# Altium footprint library DIP Component.PcbLib: 327 footprints (part 9 of 21)
Each footprint in its own frame and in the unit in brackets; x right, y up, seen from the top. Pads: shape width x height; smd on the part's side, far side on the other; paste and mask are expansions set on the pad; w line width, h text height; cw(c..) or ccw(c..) is an arc to the next point about the centre after c.
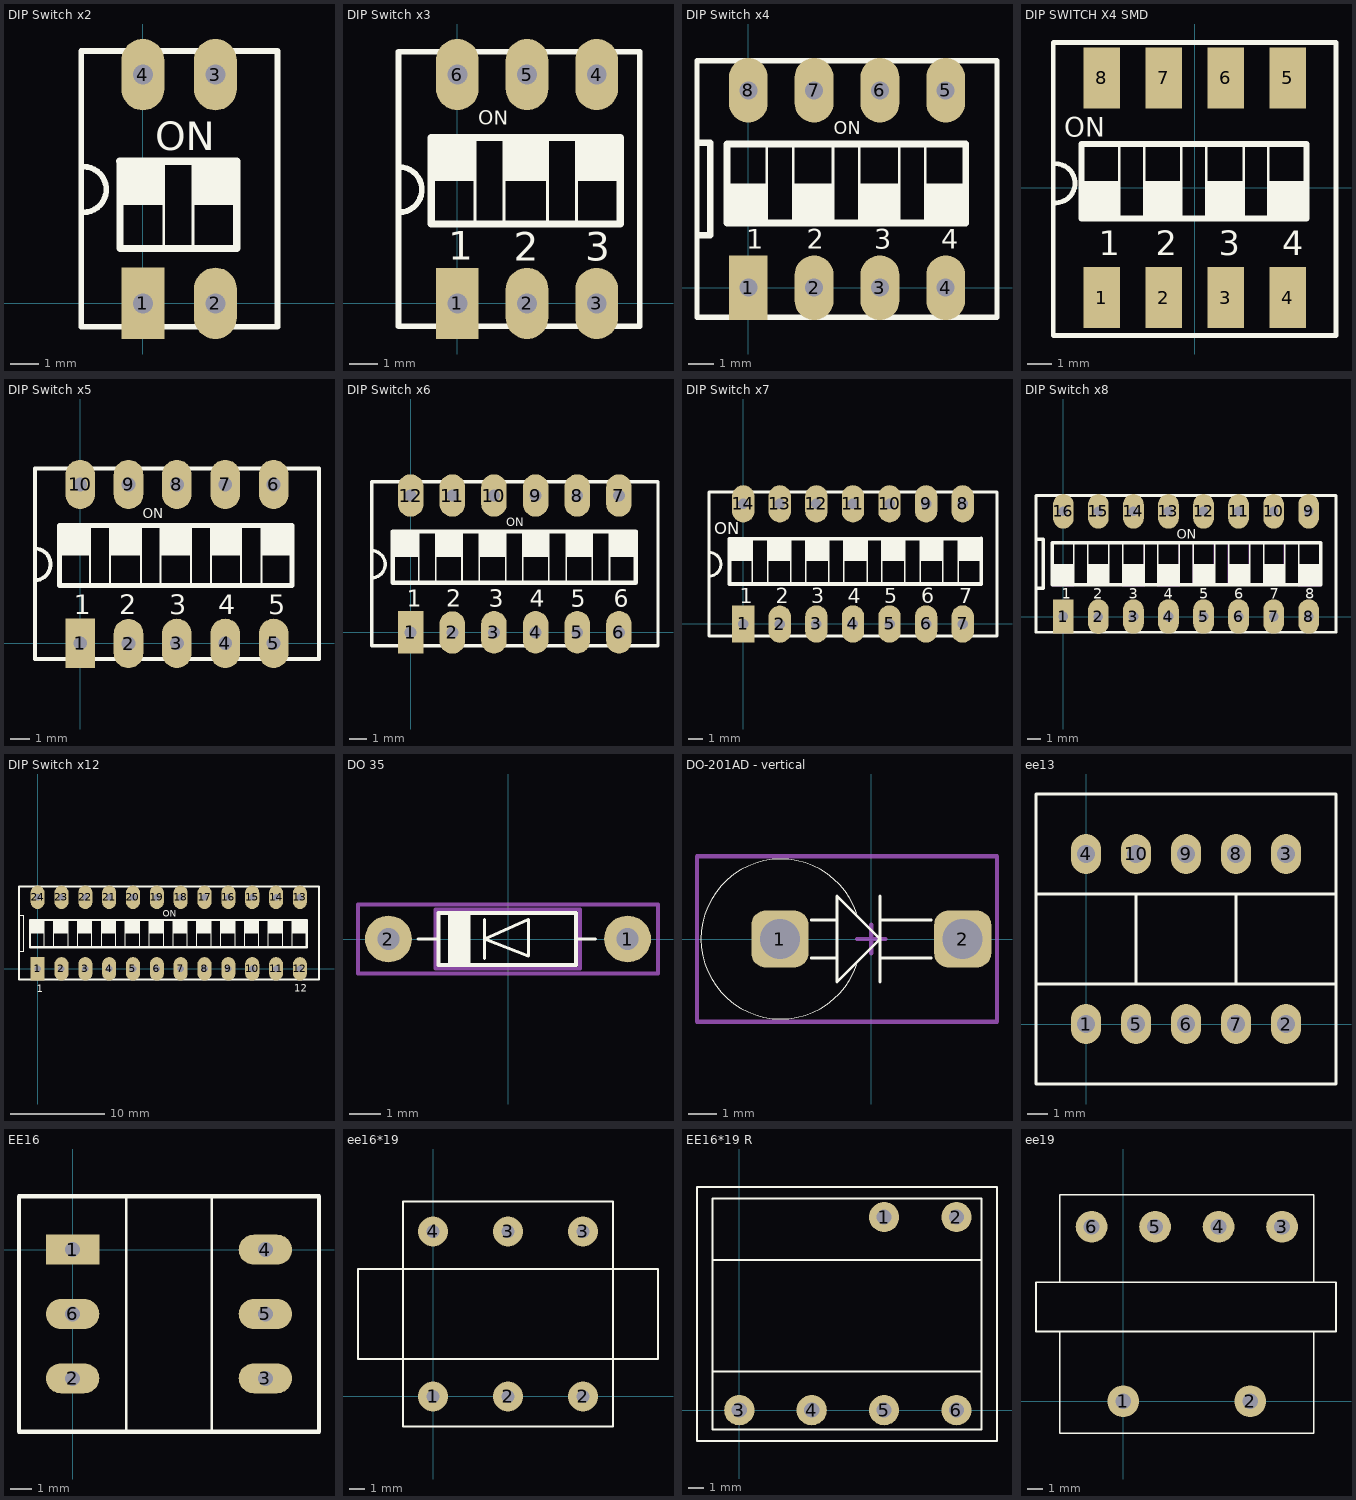
[diagram p8: the footprints below, top view; thin cyan lines are the x and y axes]

## DIP Switch x2 [mm] "Switch DIP 2 way flat slide Thru-Hole-Design:Ali Hafizi"
height 6.5
pads (4):
  rect 1.5x2.5 hole 0.7: 1(0,0)
  oval 1.5x2.5 hole 0.7: 2(2.54,0) 3(2.54,8) 4(0,8)
Top Overlay:
  region: 1.734,4.97 1.734,3.445 3.29,3.445 3.29,4.97
  region: -0.816,4.97 -0.816,3.445 0.74,3.445 0.74,4.97
  lines w0.1: 0.73,1.92 0.73,4.94 ; 1.75,1.92 1.75,4.94
  lines w0.2: -2.08,3.182 ccw(c-2.08,3.982) -2.08,4.782 ; -2.16,-0.82 -2.16,8.83 4.71,8.83 4.71,-0.82 -2.16,-0.82
  lines w0.25: -0.8,1.92 -0.8,4.94
  lines w0.254: -0.816,4.97 3.29,4.97 3.29,1.92 -0.8,1.92
  text "ON" at 0.44,5.36 h1
3D body "dip2.STEP": height 6.91, standoff -1.79, extent -1.98,-1.03 4.52,8.97

## DIP Switch x3 [mm] "Switch DIP 3 way flat slide Thru-Hole-Design:Ali Hafizi"
height 6.5
pads (6):
  rect 1.5x2.5 hole 0.7: 1(0,0)
  oval 1.5x2.5 hole 0.7: 2(2.45,0) 3(4.9,0) 4(4.9,8.05) 5(2.45,8.05) 6(0,8.05)
Top Overlay:
  region: -0.932,5.84 -0.932,4.315 0.624,4.315 0.624,5.84
  region: 1.624,5.84 1.624,4.315 3.18,4.315 3.18,5.84
  region: 4.174,5.84 4.174,4.315 5.73,4.315 5.73,5.84
  lines w0.1: 0.62,2.79 0.62,5.81 ; 1.64,2.79 1.64,5.81 ; 3.17,2.79 3.17,5.81 ; 4.19,2.79 4.19,5.81
  lines w0.2: -2.05,3.202 ccw(c-2.05,4.002) -2.05,4.802 ; -2.07,-0.8 6.41,-0.8 6.41,8.85 -2.07,8.85 -2.07,-0.8
  lines w0.25: -0.92,2.79 -0.92,5.81
  lines w0.254: -0.932,5.84 5.73,5.84 5.73,2.79 -0.92,2.79
  text "3" at 4.5,1.495 h1
  text "2" at 1.98,1.495 h1
  text "1" at -0.33,1.535 h1
  text "ON" at 0.74,6.28 h0.5
3D body "User Library-switch 3.step": height 7, standoff -3.7, extent -1.904,-0.81 6.23,9.09

## DIP Switch x4 [mm] "Switch DIP 4 way flat slide Thru-Hole-Design:Ali Hafizi"
height 6.5
pads (8):
  rect 1.5x2.5 hole 0.7: 1(0,0)
  oval 1.5x2.5 hole 0.7: 2(2.54,0) 3(5.08,0) 4(7.62,0) 5(7.62,7.62) 6(5.08,7.62) 7(2.54,7.62) 8(0,7.62)
Top Overlay:
  region: 8.394,2.497 8.394,4.022 6.838,4.022 6.838,2.497
  region: 5.84,2.497 5.84,4.022 4.284,4.022 4.284,2.497
  region: 3.284,2.497 3.284,4.022 1.728,4.022 1.728,2.497
  region: 0.734,2.497 0.734,4.022 -0.822,4.022 -0.822,2.497
  lines w0.1: 0.718,2.527 0.718,5.547 ; 1.738,2.527 1.738,5.547 ; 3.268,2.527 3.268,5.547 ; 4.288,2.527 4.288,5.547 ; 5.828,2.527 5.828,5.547 ; 6.828,2.527 6.828,5.547
  lines w0.2: -1.981,-1.143 9.601,-1.143 9.601,8.763 -1.981,8.763 -1.981,-1.143
  lines w0.25: 8.388,5.547 8.394,2.497
  lines w0.254: -1.95,2.032 -1.473,2.032 -1.473,5.588 -1.95,5.588 ; 8.388,5.547 -0.822,5.547 -0.822,2.497 8.394,2.497
  text "4" at 7.444,1.495 h0.76
  text "3" at 4.853,1.495 h0.76
  text "2" at 2.261,1.495 h0.76
  text "1" at -0.076,1.495 h0.76
  text "ON" at 3.29,5.93 h0.5
Mechanical 1:
  circle w0.025: c0,0 r0.254
  circle w0.025: c2.54,-0.01 r0.254
  circle w0.025: c5.08,0 r0.254
  circle w0.025: c7.62,0 r0.254
  circle w0.025: c7.62,7.62 r0.254
  circle w0.025: c5.08,7.62 r0.254
  circle w0.025: c2.54,7.62 r0.254
  circle w0.025: c0,7.62 r0.254
3D body: height 6.35, standoff 0.25, extent -0.762,2.562 0.762,3.273
3D body: height 0.76, standoff 0, extent -0.253,7.367 0.253,7.873
3D body: height 0.76, standoff 0, extent 2.287,7.367 2.793,7.873
3D body: height 0.76, standoff 0, extent 4.827,7.367 5.333,7.873
3D body: height 0.76, standoff 0, extent 7.367,7.367 7.873,7.873
3D body: height 0.76, standoff 0, extent -0.253,-0.253 0.253,0.253
3D body: height 0.76, standoff 0, extent 2.287,-0.263 2.793,0.243
3D body: height 0.76, standoff 0, extent 4.827,-0.253 5.333,0.253
3D body: height 0.76, standoff 0, extent 7.367,-0.253 7.873,0.253
3D body: height 3.81, standoff 0, extent -1.981,1.9 -1.473,5.71
3D body: height 5.59, standoff 0, extent -1.981,-1.143 9.652,8.763
3D body: height 0.25, standoff 0.05, extent -1.981,-1.143 9.652,8.763
3D body: height 5.08, standoff 0.25, extent -0.762,3.273 0.762,5.453
3D body: height 5.08, standoff 0.25, extent 4.318,3.273 5.842,5.453
3D body: height 6.35, standoff 0.25, extent 4.318,2.562 5.842,3.273
3D body: height 5.08, standoff 0.25, extent 6.858,3.273 8.382,5.453
3D body: height 6.35, standoff 0.25, extent 6.858,2.562 8.382,3.273
3D body: height 5.59, standoff 0, extent -1.473,2.362 -0.762,5.253
3D body: height 5.59, standoff 0, extent 0.762,2.562 1.778,5.453
3D body: height 5.59, standoff 0, extent 5.842,2.562 6.858,5.453
3D body: height 5.59, standoff 0, extent 3.302,2.562 4.318,5.453
3D body: height 5.08, standoff 0.25, extent 1.778,3.273 3.302,5.453
3D body: height 6.35, standoff 0.25, extent 1.778,2.562 3.302,3.273
3D body: height 5.59, standoff 0.25, extent -1.021,5.975 0.597,7.55
3D body: height 5.59, standoff 0.03, extent -0.618,6.06 0.189,7.478
3D body: height 5.59, standoff 0.25, extent 0.734,5.986 2.3,7.537

## DIP SWITCH X4 SMD [mm] "Switch SMD 4 way flat slide Thru-Hole-Design:Ali Hafizi"
pads (8):
  rect 1.5x2.5 smd: 1(-3.81,-4.5) 2(-1.27,-4.5) 3(1.27,-4.5) 4(3.81,-4.5) 5(3.81,4.5) 6(1.27,4.5) 7(-1.27,4.5) 8(-3.81,4.5)
Top Overlay:
  region: 4.584,-1.253 4.584,0.272 3.028,0.272 3.028,-1.253
  region: 2.03,-1.253 2.03,0.272 0.474,0.272 0.474,-1.253
  region: -0.526,-1.253 -0.526,0.272 -2.082,0.272 -2.082,-1.253
  region: -3.076,-1.253 -3.076,0.272 -4.632,0.272 -4.632,-1.253
  lines w0.1: -3.092,-1.223 -3.092,1.797 ; -2.072,-1.223 -2.072,1.797 ; -0.542,-1.223 -0.542,1.797 ; 0.478,-1.223 0.478,1.797 ; 2.018,-1.223 2.018,1.797 ; 3.018,-1.223 3.018,1.797
  lines w0.2: -5.7,-0.618 ccw(c-5.7,0.182) -5.7,0.982 ; -5.791,-6.06 5.791,-6.06 5.791,5.96 -5.791,5.96 -5.791,-6.06
  lines w0.25: 4.578,1.797 4.584,1.797 4.584,-1.253
  lines w0.254: 4.578,1.797 -4.632,1.797 -4.632,-1.253 4.584,-1.253
  text "4" at 3.584,-2.755 h1
  text "3" at 0.993,-2.755 h1
  text "2" at -1.599,-2.755 h1
  text "1" at -3.936,-2.755 h1
  text "ON" at -5.35,2.1 h0.8
3D body "User Library-SMD DIP-4 switch.step": height 4.9, standoff 0, extent -5.55,-4.94 5.55,4.86

## DIP Switch x5 [mm] "Switch DIP 5 way flat slide Thru-Hole-19624"
height 6.5
pads (10):
  rect 1.5x2.5 hole 0.7: 1(0,0)
  oval 1.5x2.5 hole 0.7: 2(2.45,-0.01) 3(4.9,0) 4(7.35,0) 5(9.8,0) 6(9.8,8.05) 7(7.35,8.05) 8(4.9,8.05) 9(2.45,8.05) 10(0,8.05)
Top Overlay:
  region: -1.046,5.97 -1.046,4.445 0.51,4.445 0.51,5.97
  region: 1.504,5.97 1.504,4.445 3.06,4.445 3.06,5.97
  region: 4.058,5.97 4.058,4.445 5.614,4.445 5.614,5.97
  region: 6.614,5.97 6.614,4.445 8.17,4.445 8.17,5.97
  region: 9.164,5.97 9.164,4.445 10.72,4.445 10.72,5.97
  lines w0.1: 0.5,2.92 0.5,5.94 ; 1.51,2.92 1.51,5.94 ; 3.07,2.92 3.07,5.94 ; 4.07,2.92 4.07,5.94 ; 5.61,2.92 5.61,5.94 ; 6.63,2.92 6.63,5.94 ; 8.16,2.92 8.16,5.94 ; 9.18,2.92 9.18,5.94
  lines w0.2: -2.3,3.202 ccw(c-2.3,4.002) -2.3,4.802 ; -2.3,-0.8 12.1,-0.8 12.1,8.85 -2.3,8.85 -2.3,-0.8
  lines w0.25: -1.04,2.92 -1.04,5.97
  lines w0.254: -1.04,2.92 10.72,2.92 10.72,5.97 -1.04,5.97
  text "5" at 9.52,1.465 h1
  text "4" at 6.99,1.465 h1
  text "3" at 4.5,1.465 h1
  text "2" at 1.98,1.465 h1
  text "1" at -0.33,1.465 h1
  text "ON" at 3.17,6.33 h0.5
3D body "User Library-Switch DIP 5 way flat slide Thru-Hole-19624.step": height 7.2, standoff -2, extent -2.22,-0.93 12.04,8.97

## DIP Switch x6 [mm] "Switch DIP 6 way flat slide Thru-Hole-Design:Ali Hafizi"
height 6.5
pads (12):
  rect 1.5x2.5 hole 0.7: 1(0,0)
  oval 1.5x2.5 hole 0.7: 2(2.45,-0.01) 3(4.9,0) 4(7.35,0) 5(9.8,0) 6(12.25,0) 7(12.25,8.05) 8(9.8,8.05) 9(7.35,8.05) 10(4.9,8.05) 11(2.45,8.05) 12(0,8.05)
Top Overlay:
  region: -1.076,5.96 -1.076,4.435 0.48,4.435 0.48,5.96
  region: 1.474,5.96 1.474,4.435 3.03,4.435 3.03,5.96
  region: 4.024,5.96 4.024,4.435 5.58,4.435 5.58,5.96
  region: 6.578,5.96 6.578,4.435 8.134,4.435 8.134,5.96
  region: 9.134,5.96 9.134,4.435 10.69,4.435 10.69,5.96
  region: 11.684,5.96 11.684,4.435 13.24,4.435 13.24,5.96
  lines w0.1: 0.47,2.91 0.47,5.93 ; 1.48,2.91 1.48,5.93 ; 3.02,2.91 3.02,5.93 ; 4.03,2.91 4.03,5.93 ; 5.59,2.91 5.59,5.93 ; 6.59,2.91 6.59,5.93 ; 8.13,2.91 8.13,5.93 ; 9.15,2.91 9.15,5.93 ; 10.68,2.91 10.68,5.93 ; 11.7,2.91 11.7,5.93
  lines w0.2: -2.3,3.202 ccw(c-2.3,4.002) -2.3,4.802 ; -2.3,-0.8 14.55,-0.8 14.55,8.85 -2.3,8.85 -2.3,-0.8
  lines w0.25: -1.06,2.91 -1.06,5.93
  lines w0.254: -1.06,2.91 13.24,2.91 13.24,5.93 -1.06,5.93
  text "6" at 11.94,1.495 h1
  text "5" at 9.42,1.495 h1
  text "4" at 6.99,1.495 h1
  text "3" at 4.6,1.495 h1
  text "2" at 2.08,1.495 h1
  text "1" at -0.23,1.495 h1
  text "ON" at 5.63,6.23 h0.5
3D body "User Library-106S.STEP": height 6.43, standoff -2.42, extent -2.19,-0.82 14.51,8.88

## DIP Switch x7 [mm] "Switch DIP 7 way flat slide Thru-Hole-Design:Ali Hafizi"
height 6.5
pads (14):
  rect 1.5x2.5 hole 0.7: 1(0,0)
  oval 1.5x2.5 hole 0.7: 2(2.45,-0.01) 3(4.9,0) 4(7.35,0) 5(9.8,0) 6(12.25,0) 7(14.7,0) 8(14.7,8.05) 9(12.25,8.05) 10(9.8,8.05) 11(7.35,8.05) 12(4.9,8.05) 13(2.45,8.05) 14(0,8.05)
Top Overlay:
  region: -0.936,5.73 -0.936,4.205 0.62,4.205 0.62,5.73
  region: 1.624,5.73 1.624,4.205 3.18,4.205 3.18,5.73
  region: 4.174,5.73 4.174,4.205 5.73,4.205 5.73,5.73
  region: 6.724,5.73 6.724,4.205 8.28,4.205 8.28,5.73
  region: 9.278,5.73 9.278,4.205 10.834,4.205 10.834,5.73
  region: 11.834,5.73 11.834,4.205 13.39,4.205 13.39,5.73
  region: 14.384,5.73 14.384,4.205 15.94,4.205 15.94,5.73
  lines w0.1: 0.61,2.68 0.61,5.7 ; 1.64,2.68 1.64,5.7 ; 3.17,2.68 3.17,5.7 ; 4.18,2.68 4.18,5.7 ; 5.72,2.68 5.72,5.7 ; 6.73,2.68 6.73,5.7 ; 8.29,2.68 8.29,5.7 ; 9.29,2.68 9.29,5.7 ; 10.83,2.68 10.83,5.7 ; 11.85,2.68 11.85,5.7 ; 13.38,2.68 13.38,5.7 ; 14.4,2.68 14.4,5.7
  lines w0.2: -2.3,3.202 ccw(c-2.3,4.002) -2.3,4.802 ; -2.3,-0.8 17,-0.8 17,8.85 -2.3,8.85 -2.3,-0.8
  lines w0.25: -0.92,2.68 -0.92,5.7
  lines w0.254: -0.92,2.68 15.94,2.68 15.94,5.73 -0.92,5.7
  text "7" at 14.47,1.395 h1
  text "6" at 11.94,1.395 h1
  text "5" at 9.43,1.395 h1
  text "4" at 6.99,1.395 h1
  text "3" at 4.57,1.395 h1
  text "2" at 2.16,1.395 h1
  text "1" at -0.23,1.395 h1
  text "ON" at -1.93,6.02 h0.8
3D body "User Library-DIPSWITCH7.step": height 7, standoff -3.1, extent -2.29,-1 16.85,9.16

## DIP Switch x8 [mm] "Switch DIP 8 way flat slide Thru-Hole-Design:Ali Hafizi"
height 6.5
pads (16):
  rect 1.5x2.5 hole 0.7: 1(0,0)
  oval 1.5x2.5 hole 0.7: 2(2.54,-0.01) 3(5.08,0) 4(7.62,0) 5(10.16,0) 6(12.7,0) 7(15.24,0) 8(17.78,0) 9(17.78,7.62) 10(15.24,7.62) 11(12.7,7.62) 12(10.16,7.62) 13(7.62,7.62) 14(5.08,7.62) 15(2.54,7.62) 16(0,7.62)
Top Overlay:
  region: 18.629,2.297 18.629,3.822 17.073,3.822 17.073,2.297
  region: 16.079,2.297 16.079,3.822 14.523,3.822 14.523,2.297
  region: 13.519,2.297 13.519,3.822 11.963,3.822 11.963,2.297
  region: 10.969,2.297 10.969,3.822 9.413,3.822 9.413,2.297
  region: 8.419,2.297 8.419,3.822 6.863,3.822 6.863,2.297
  region: 5.866,2.297 5.866,3.822 4.309,3.822 4.309,2.297
  region: 3.309,2.297 3.309,3.822 1.753,3.822 1.753,2.297
  region: 0.759,2.297 0.759,3.822 -0.797,3.822 -0.797,2.297
  lines w0.1: 0.743,2.327 0.743,5.347 ; 1.763,2.327 1.763,5.347 ; 3.293,2.327 3.293,5.347 ; 4.313,2.327 4.313,5.347 ; 5.853,2.327 5.853,5.347 ; 6.853,2.327 6.853,5.347 ; 8.413,2.327 8.413,5.347 ; 9.423,2.327 9.423,5.347 ; 10.963,2.327 10.963,5.347 ; 11.973,2.327 11.973,5.347 ; 13.503,2.327 13.503,5.347 ; 14.533,2.327 14.533,5.347 ; 16.063,2.327 16.063,5.347 ; 17.073,2.327 17.073,5.347
  lines w0.2: -1.981,-1.143 19.761,-1.143 19.761,8.763 -1.981,8.763 -1.981,-1.143
  lines w0.254: -1.94,2.032 -1.473,2.032 -1.473,5.588 -1.93,5.588 ; -0.797,2.297 -0.797,5.347 18.653,5.347 18.653,2.297 -0.797,2.297
  text "8" at 17.526,1.295 h0.76
  text "7" at 14.965,1.295 h0.76
  text "6" at 12.405,1.295 h0.76
  text "5" at 9.844,1.295 h0.76
  text "4" at 7.284,1.295 h0.76
  text "3" at 4.723,1.295 h0.76
  text "2" at 2.163,1.295 h0.76
  text "1" at -0.101,1.295 h0.76
  text "ON" at 8.23,5.65 h0.7
Mechanical 1:
  circle w0.025: c17.78,0 r0.254
  circle w0.025: c17.78,7.62 r0.254
  circle w0.025: c15.24,7.62 r0.254
  circle w0.025: c15.24,0 r0.254
  circle w0.025: c12.7,0 r0.254
  circle w0.025: c12.7,7.62 r0.254
  circle w0.025: c10.16,7.62 r0.254
  circle w0.025: c10.16,0 r0.254
  circle w0.025: c7.62,0 r0.254
  circle w0.025: c7.62,7.62 r0.254
  circle w0.025: c5.08,7.62 r0.254
  circle w0.025: c5.08,0 r0.254
  circle w0.025: c2.54,-0.01 r0.254
  circle w0.025: c2.54,7.62 r0.254
  circle w0.025: c0,7.62 r0.254
  circle w0.025: c0,0 r0.254
  lines w0.025: 0.762,5.334 0.762,5.41 -0.813,5.41 -0.813,2.235 0.762,2.235 0.762,5.359 ; 4.318,5.334 5.867,5.334 5.867,2.235 4.318,2.235 4.318,5.359 ; 6.833,5.309 8.407,5.309 8.407,2.235 6.833,2.235 6.833,5.359 ; 9.423,5.359 10.947,5.359 10.947,2.261 9.423,2.261 9.423,5.385 ; 11.938,5.309 13.487,5.309 13.487,2.261 11.938,2.261 11.938,5.359 ; 14.529,5.334 14.529,2.261 16.027,2.261 16.027,5.359 14.529,5.359 ; 17.069,5.334 18.694,5.334 18.694,2.235 17.069,2.235 17.069,5.359 ; -1.981,-1.143 -1.981,8.763 19.761,8.763 19.761,-1.143 -1.981,-1.143 ; -1.981,2.032 -1.473,2.032 -1.473,5.588 -1.981,5.588 -1.981,2.032 ; 1.778,2.261 1.778,5.334 3.302,5.334 3.302,2.261 1.778,2.261
3D body: height 0.76, standoff 0, extent 9.867,7.337 10.373,7.843
3D body: height 6.35, standoff 0, extent 17.069,2.235 18.693,3.759
3D body: height 6.35, standoff 0, extent 14.529,2.236 16.154,3.76
3D body: height 6.35, standoff 0, extent 11.938,2.261 13.563,3.785
3D body: height 6.35, standoff 0, extent 9.423,2.262 11.048,3.786
3D body: height 6.35, standoff 0, extent 6.833,2.236 8.457,3.76
3D body: height 6.35, standoff 0, extent 4.318,2.236 5.943,3.76
3D body: height 6.35, standoff 0, extent 1.778,2.261 3.403,3.785
3D body: height 6.35, standoff 0, extent -0.813,2.235 0.812,3.759
3D body: height 5.08, standoff 0, extent -0.813,2.312 0.812,5.41
3D body: height 5.08, standoff 0, extent 1.778,2.312 3.403,5.41
3D body: height 5.08, standoff 0, extent 9.423,2.262 11.048,5.359
3D body: height 5.08, standoff 0, extent 11.938,2.339 13.563,5.437
3D body: height 5.08, standoff 0, extent 14.529,2.338 16.153,5.436
3D body: height 0.76, standoff 0, extent 17.527,-0.253 18.033,0.253
3D body: height 0.76, standoff 0, extent 14.987,-0.253 15.493,0.253
3D body: height 0.76, standoff 0, extent 12.447,-0.253 12.953,0.253
3D body: height 0.76, standoff 0, extent 9.907,-0.253 10.413,0.253
3D body: height 5.08, standoff 0, extent 17.069,2.313 18.693,5.411
3D body: height 5.08, standoff 0, extent 14.528,2.26 16.028,5.36
3D body: height 5.08, standoff 0, extent 6.832,2.339 8.405,5.411
3D body: height 0.76, standoff 0, extent 7.367,-0.253 7.873,0.253
3D body: height 0.76, standoff 0, extent 4.827,-0.253 5.333,0.253
3D body: height 0.76, standoff 0, extent 2.287,-0.263 2.793,0.243
3D body: height 0.76, standoff 0, extent -0.253,-0.253 0.253,0.253
3D body: height 5.08, standoff 0, extent 4.318,2.236 5.866,5.334
3D body: height 0.76, standoff 0, extent 14.987,7.367 15.493,7.873
3D body: height 0.76, standoff 0, extent 12.447,7.367 12.953,7.873
3D body: height 0.76, standoff 0, extent 17.527,7.367 18.033,7.873
3D body: height 0.76, standoff 0, extent -0.253,7.367 0.253,7.873
3D body: height 0.76, standoff 0, extent 7.367,7.367 7.873,7.873
3D body: height 0.76, standoff 0, extent 4.827,7.367 5.333,7.873
3D body: height 0.76, standoff 0, extent 2.287,7.367 2.793,7.873
3D body: height 3.81, standoff 0, extent -1.981,2.032 -1.473,5.613
3D body: height 5.59, standoff 0, extent -1.981,-1.143 19.761,2.236
3D body: height 5.59, standoff 0, extent -1.981,5.41 19.761,8.763
3D body: height 5.59, standoff 0, extent -1.473,2.235 -0.813,5.41
3D body: height 5.59, standoff 0, extent 0.762,2.235 1.778,5.41
3D body: height 5.59, standoff 0, extent 3.403,2.236 4.318,5.411
3D body: height 5.59, standoff 0, extent 5.866,2.236 6.832,5.411
3D body: height 5.59, standoff 0, extent 8.407,2.236 9.423,5.411
3D body: height 5.59, standoff 0, extent 11.048,2.262 11.938,5.437
3D body: height 5.59, standoff 0, extent 13.487,2.261 14.529,5.436
3D body: height 5.59, standoff 0, extent 16.154,2.236 17.069,5.411
3D body: height 5.59, standoff 0, extent 18.693,2.235 19.761,5.41
3D body: height 5.59, standoff 0.25, extent -0.796,5.735 0.822,7.309
3D body: height 5.59, standoff 0.03, extent -0.394,5.82 0.414,7.237
3D body: height 5.59, standoff 0.25, extent 0.959,5.745 2.525,7.297

## DIP Switch x12 [mm] "Switch DIP 12 way flat slide Thru-Hole-Design:Ali Hafizi"
pads (24):
  rect 1.5x2.5 hole 0.7: 1(0,0)
  oval 1.5x2.5 hole 0.7: 2(2.54,0) 3(5.08,0) 4(7.62,0) 5(10.16,0) 6(12.7,0) 7(15.24,0) 8(17.78,0) 9(20.32,0) 10(22.86,0) 11(25.4,0) 12(27.94,0) 13(27.94,7.62) 14(25.4,7.62) 15(22.86,7.62) 16(20.32,7.62) 17(17.78,7.62) 18(15.24,7.62) 19(12.7,7.62) 20(10.16,7.62) 21(7.62,7.62) 22(5.08,7.62) 23(2.54,7.62) 24(0,7.62)
Top Overlay:
  region: 28.652,3.752 28.652,5.198 27.128,5.198 27.128,3.752
  region: 26.112,3.752 26.112,5.198 24.588,5.198 24.588,3.752
  region: 23.572,3.752 23.572,5.198 22.048,5.198 22.048,3.752
  region: 21.032,3.752 21.032,5.198 19.508,5.198 19.508,3.752
  region: 18.492,3.752 18.492,5.198 16.968,5.198 16.968,3.752
  region: 15.952,3.752 15.952,5.198 14.428,5.198 14.428,3.752
  region: 13.412,3.752 13.412,5.198 11.888,5.198 11.888,3.752
  region: 10.872,3.752 10.872,5.198 9.348,5.198 9.348,3.752
  region: 8.332,3.752 8.332,5.198 6.808,5.198 6.808,3.752
  region: 5.792,3.752 5.792,5.198 4.268,5.198 4.268,3.752
  region: 3.252,3.752 3.252,5.198 1.728,5.198 1.728,3.752
  region: 0.712,3.752 0.712,5.198 -0.812,5.198 -0.812,3.752
  lines w0.1: -0.812,2.307 -0.812,5.198 ; 0.712,2.307 0.712,5.198 ; 1.728,2.307 1.728,5.198 ; 3.252,2.307 3.252,5.198 ; 4.268,2.307 4.268,5.198 ; 5.792,2.307 5.792,5.198 ; 6.808,2.307 6.808,5.198 ; 8.332,2.307 8.332,5.198 ; 9.348,2.307 9.348,5.198 ; 10.872,2.307 10.872,5.198 ; 11.888,2.307 11.888,5.198 ; 13.412,2.307 13.412,5.198 ; 14.428,2.307 14.428,5.198 ; 15.952,2.307 15.952,5.198 ; 16.968,2.307 16.968,5.198 ; 18.492,2.307 18.492,5.198 ; 19.508,2.307 19.508,5.198 ; 21.032,2.307 21.032,5.198 ; 22.048,2.307 22.048,5.198 ; 23.572,2.307 23.572,5.198 ; 24.588,2.307 24.588,5.198 ; 26.112,2.307 26.112,5.198 ; 27.128,2.307 27.128,5.198
  lines w0.127: -1.981,1.9 -1.473,1.9 -1.473,5.71 -1.981,5.71
  lines w0.2: -1.981,-1.143 -1.981,8.763 29.972,8.763 29.972,-1.143 -1.981,-1.143
  lines w0.254: -0.812,2.307 28.652,2.307 28.652,5.198 -0.812,5.198 -0.812,2.307
  text "ON" at 13.34,5.55 h0.7
  text "12" at 27.36,-2.43 h0.76
  text "1" at -0.08,-2.51 h0.76
Mechanical 1:
  circle w0.025: c17.78,0 r0.254
  circle w0.025: c17.78,7.62 r0.254
  circle w0.025: c15.24,0 r0.254
  circle w0.025: c12.7,0 r0.254
  circle w0.025: c12.7,7.62 r0.254
  circle w0.025: c10.16,7.62 r0.254
  circle w0.025: c10.16,0 r0.254
  circle w0.025: c0,0 r0.254
  circle w0.025: c2.54,-0.01 r0.254
  circle w0.025: c5.08,0 r0.254
  circle w0.025: c7.62,0 r0.254
  circle w0.025: c7.62,7.62 r0.254
  circle w0.025: c5.08,7.62 r0.254
  circle w0.025: c2.54,7.62 r0.254
  circle w0.025: c0,7.62 r0.254
3D body: height 0.76, standoff 0, extent 20.067,7.367 20.573,7.873
3D body: height 0.76, standoff 0, extent 22.607,7.367 23.113,7.873
3D body: height 0.76, standoff 0, extent 25.147,7.367 25.653,7.873
3D body: height 0.76, standoff 0, extent 27.687,7.367 28.193,7.873
3D body: height 0.76, standoff 0, extent 27.687,-0.253 28.193,0.253
3D body: height 0.76, standoff 0, extent 25.147,-0.253 25.653,0.253
3D body: height 0.76, standoff 0, extent 22.607,-0.253 23.113,0.253
3D body: height 0.76, standoff 0, extent 20.067,-0.253 20.573,0.253
3D body: height 0.76, standoff 0, extent 17.527,-0.253 18.033,0.253
3D body: height 0.76, standoff 0, extent 14.987,-0.253 15.493,0.253
3D body: height 0.76, standoff 0, extent 12.447,-0.253 12.953,0.253
3D body: height 0.76, standoff 0, extent 9.907,-0.253 10.413,0.253
3D body: height 0.76, standoff 0, extent 12.447,7.367 12.953,7.873
3D body: height 0.76, standoff 0, extent 17.527,7.367 18.033,7.873
3D body: height 0.76, standoff 0, extent 14.987,7.367 15.493,7.873
3D body: height 6.35, standoff 0.25, extent 27.128,4.487 28.652,5.198
3D body: height 0.76, standoff 0, extent -0.253,7.367 0.253,7.873
3D body: height 0.76, standoff 0, extent 2.287,7.367 2.793,7.873
3D body: height 0.76, standoff 0, extent 4.827,7.367 5.333,7.873
3D body: height 0.76, standoff 0, extent 7.367,7.367 7.873,7.873
3D body: height 0.76, standoff 0, extent -0.253,-0.253 0.253,0.253
3D body: height 0.76, standoff 0, extent 2.287,-0.263 2.793,0.243
3D body: height 0.76, standoff 0, extent 4.827,-0.253 5.333,0.253
3D body: height 0.76, standoff 0, extent 7.367,-0.253 7.873,0.253
3D body: height 3.81, standoff 0, extent -1.981,1.9 -1.473,5.71
3D body: height 5.59, standoff 0, extent -1.981,-1.143 29.972,8.763
3D body: height 0.25, standoff 0.05, extent -1.981,-1.143 29.972,8.763
3D body: height 5.08, standoff 0.25, extent 27.128,2.307 28.652,4.487
3D body: height 5.08, standoff 0.25, extent 22.048,2.307 23.572,4.487
3D body: height 6.35, standoff 0.25, extent 22.048,4.487 23.572,5.198
3D body: height 5.08, standoff 0.25, extent 19.508,2.307 21.032,4.487
3D body: height 6.35, standoff 0.25, extent 19.508,4.487 21.032,5.198
3D body: height 5.59, standoff 0, extent -1.473,2.362 -0.762,5.253
3D body: height 5.59, standoff 0, extent 26.112,2.307 27.128,5.198
3D body: height 5.59, standoff 0, extent 21.032,2.307 22.048,5.198
3D body: height 5.59, standoff 0, extent 23.572,2.307 24.588,5.198
3D body: height 5.08, standoff 0.25, extent 24.588,2.307 26.112,4.487
3D body: height 6.35, standoff 0.25, extent 24.588,4.487 26.112,5.198
3D body: height 6.35, standoff 0.25, extent 16.968,4.487 18.492,5.198
3D body: height 5.08, standoff 0.25, extent 16.968,2.307 18.492,4.487
3D body: height 5.59, standoff 0, extent 18.492,2.307 19.508,5.198
3D body: height 6.35, standoff 0.25, extent 14.428,4.487 15.952,5.198
3D body: height 5.08, standoff 0.25, extent 14.428,2.307 15.952,4.487
3D body: height 5.59, standoff 0, extent 15.952,2.307 16.968,5.198
3D body: height 6.35, standoff 0.25, extent 11.888,4.487 13.412,5.198
3D body: height 5.08, standoff 0.25, extent 11.888,2.307 13.412,4.487
3D body: height 5.59, standoff 0, extent 13.412,2.307 14.428,5.198
3D body: height 6.35, standoff 0.25, extent 9.348,4.487 10.872,5.198
3D body: height 5.08, standoff 0.25, extent 9.348,2.307 10.872,4.487
3D body: height 5.59, standoff 0, extent 10.872,2.307 11.888,5.198
3D body: height 6.35, standoff 0.25, extent 6.808,4.487 8.332,5.198
3D body: height 5.08, standoff 0.25, extent 6.808,2.307 8.332,4.487
3D body: height 5.59, standoff 0, extent 8.332,2.307 9.348,5.198
3D body: height 6.35, standoff 0.25, extent 4.268,4.487 5.792,5.198
3D body: height 5.08, standoff 0.25, extent 4.268,2.307 5.792,4.487
3D body: height 5.59, standoff 0, extent 5.792,2.307 6.808,5.198
3D body: height 6.35, standoff 0.25, extent 1.728,4.487 3.252,5.198
3D body: height 5.08, standoff 0.25, extent 1.728,2.307 3.252,4.487
3D body: height 5.59, standoff 0, extent 3.252,2.307 4.268,5.198
3D body: height 6.35, standoff 0.25, extent -0.812,4.487 0.712,5.198
3D body: height 5.08, standoff 0.25, extent -0.812,2.307 0.712,4.487
3D body: height 5.59, standoff 0, extent 0.712,2.307 1.728,5.198
3D body: height 5.59, standoff 0.25, extent -0.956,6.005 0.662,7.579
3D body: height 5.59, standoff 0.03, extent -0.554,6.09 0.254,7.507
3D body: height 5.59, standoff 0.25, extent 0.799,6.015 2.365,7.567

## DO 35 [mm] "Diode"
height 1.6
pads (2):
  round 1.5 hole 0.7: 1(3.825,0) 2(-3.825,0)
Top Overlay:
  rectangle: -1.925,-0.85 -1.2,0.85
  lines w0.1: -2.875,0 -2.225,0 ; -0.75,-0.625 -0.75,0.625 ; 2.175,0 2.8,0 ; -0.75,0 0.65,0.625 0.65,-0.55 -0.75,0
  lines w0.127: -2.225,-0.825 2.175,-0.825 2.175,0.825 -2.225,0.825 -2.225,-0.825
Mechanical 13:
  lines w0.127: -2.325,-0.95 -2.325,0.95 2.3,0.95 2.3,-0.95 -2.325,-0.95
Mechanical 15:
  lines w0.127: -4.8,-1.1 4.8,-1.1 4.8,1.1 -4.8,1.1 -4.8,-1.1
3D body "User Library-DO-35-300mil.STEP": height 2.46, standoff -1.95, extent -4.1,-0.96 4.08,0.96

## DO-201AD - vertical [mm] "Designer Abbas Basereh"
height 12
pads (2):
  rrect50% 2x2 hole 1.4: 1(-3.2,0) 2(3.2,0)
Top Overlay:
  lines w0.013: -3.164,-0.66 cw(c-3.164,0) -3.164,0.66 ; -3.163,-0.658 cw(c-3.166,0) -3.164,0.658 ; -0.511,-0.896 cw(c-3.164,0) -0.511,0.896 ; 3.266,-0.66 ccw(c3.266,0) 3.926,0 ccw(c3.266,0) 3.266,0.66 ; 3.266,-0.658 ccw(c3.269,0) 3.266,0.658
  lines w0.1: -2.1,-0.66 -1.2,-0.66 ; -2.1,0.66 -1.2,0.66 ; 0.3,-1.5 0.3,1.5 ; 0.3,-0.66 2.1,-0.66 ; 0.3,0.66 2.1,0.66 ; -1.2,-1.5 -1.2,1.5 0.3,0 -1.2,-1.5
Mechanical 15:
  lines w0.15: -0.5,0 0.5,0 ; 0,-0.5 0,0.5 ; -6.1,-2.9 -6.1,2.9 4.4,2.9 4.4,-2.9 -6.1,-2.9
3D body "User Library-User Library-DO-201AV-Vertical_2001.STEP": height 15.69, standoff -3, extent -6.045,-2.8 3.845,2.8

## ee13 [mm] "EE13"
pads (10):
  oval 1.5x2 hole 0.9: 1(0,0) 2(10,0) 3(10,8.5) 4(0,8.5) 5(2.5,0) 6(5,0) 7(7.5,0) 8(7.5,8.5) 9(5,8.5) 10(2.5,8.5)
Top Overlay:
  lines w0.127: -2.5,2 12.5,2 2.5,2 2.5,6.5 7.5,6.5 7.5,2 ; -2.5,6.5 12.5,6.5 ; -2.5,-3 -2.5,-1 -2.5,11.5 12.5,11.5 12.5,-3 -2.5,-3

## EE16 [mm] "EE166"
pads (6):
  rect 2.5x1.4 hole 0.7: 1(0,0)
  oval 2.5x1.4 hole 0.7: 2(0,-6) 3(9,-6) 4(9,0) 5(9,-3) 6(0,-3)
Top Overlay:
  lines w0.127: 2.5,2.5 2.5,-8.5 6.5,-8.5 6.5,2.5
  lines w0.2: -2.5,-8.5 11.5,-8.5 11.5,2.5 4.25,2.5 -2.5,2.5 -2.5,-8.5

## ee16*19 [mm] "EE16*19"
pads (6):
  round 2 hole 0.85: 1(0,0) 2(5,0) 2(10,0) 3(5,11) 3(10,11) 4(0,11)
Top Overlay:
  lines w0.127: -5,2.5 -2,2.5 12,2.5 15,2.5 15,8 15,8.5 12,8.5 -2,8.5 -5,8.5 -5,3 -5,2.5 ; -2,-2 0,-2 12,-2 12,5 12,12 12,13 -2,13 -2,12 -2,-2

## EE16*19 R [mm]
pads (6):
  round 2 hole 1: 1(9.56,12.75) 2(14.34,12.75) 3(0,0) 4(4.78,0) 5(9.56,0) 6(14.34,0)
Top Overlay:
  lines w0.127: -1.778,2.54 15.748,2.54 16.002,2.54 ; -1.778,9.906 16.002,9.906 ; -2.794,-2.032 -2.794,14.732 17.018,14.732 17.018,-2.032 -2.794,-2.032 ; -1.778,-1.27 -1.778,13.97 16.002,13.97 16.002,-1.27 -1.778,-1.27

## ee19 [mm] "ee19"
pads (6):
  round 2 hole 1: 1(0,0) 2(8,0) 3(10,11) 4(6,11) 5(2,11) 6(-2,11)
Top Overlay:
  lines w0.1: 12,4.4 12,-2 -4,-2 -4,4.4 ; -4,4.4 -5.5,4.4 -5.5,7.5 -4,7.5 ; -4,4.4 13.4,4.4 13.4,7.5 12,7.5 ; -4,7.5 -4,13 10,13 12,13 12,7.5 ; -4,7.5 12,7.5